# Altium footprint library hphonglib.PcbLib: 703 footprints (part 18 of 44)
Each footprint in its own frame and in the unit in brackets; x right, y up, seen from the top. Pads: shape width x height; smd on the part's side, far side on the other; paste and mask are expansions set on the pad; w line width, h text height; cw(c..) or ccw(c..) is an arc to the next point about the centre after c.
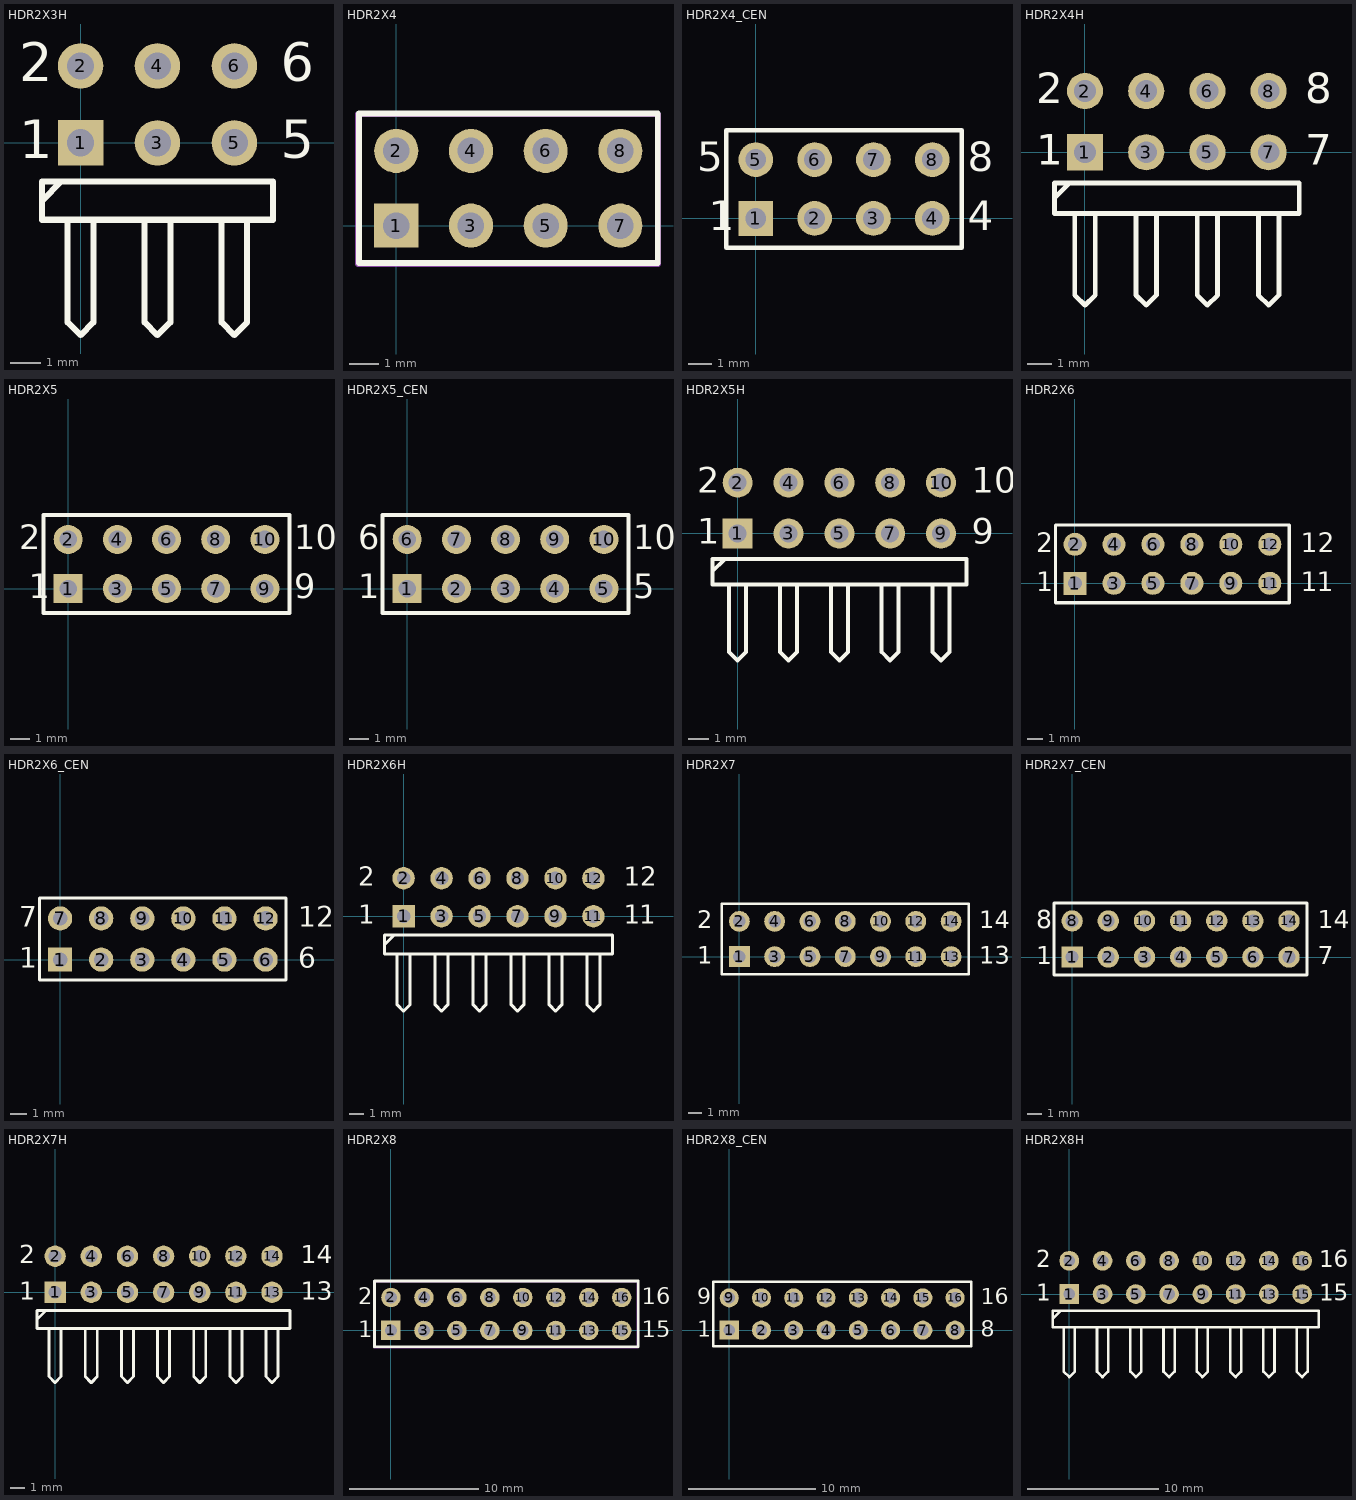
[diagram p17: the footprints below, top view; thin cyan lines are the x and y axes]

## HDR2X3H [mm]
pads (6):
  rect 1.5x1.5 hole 0.9: 1(0,0)
  round 1.5 hole 0.9: 2(0,2.54) 3(2.54,0) 4(2.54,2.54) 5(5.08,0) 6(5.08,2.54)
Top Overlay:
  lines w0.2: -1.27,-1.905 -0.635,-1.27 ; -0.423,-2.54 -0.423,-5.927 0,-6.35 0.423,-5.927 0.423,-2.54 ; 2.117,-2.54 2.117,-5.927 2.54,-6.35 2.963,-5.927 2.963,-2.54 ; 4.657,-2.54 4.657,-5.927 5.08,-6.35 5.503,-5.927 5.503,-2.54 ; -1.27,-2.54 6.35,-2.54 6.35,-1.27 -1.27,-1.27 -1.27,-2.54
  text "2" at -2.032,2.032 h1.27
  text "1" at -2.032,-0.508 h1.27
  text "5" at 6.604,-0.508 h1.27
  text "6" at 6.604,2.032 h1.27
Mechanical 13:
  text ".Designator" at 0.483,0.66 h2.03

## HDR2X4 [mm]
pads (8):
  rect 1.5x1.5 hole 0.9: 1(0,0)
  round 1.5 hole 0.9: 2(0,2.54) 3(2.54,0) 4(2.54,2.54) 5(5.08,0) 6(5.08,2.54) 7(7.62,0) 8(7.62,2.54)
Top Overlay:
  lines w0.2: -1.27,-1.27 8.89,-1.27 8.89,3.81 -1.27,3.81 -1.27,-1.27
  text "." at -2.794,-2.032 h1
Bottom Overlay:
  lines w0.1: -1.295,-1.321 -1.295,3.785 8.89,3.785 8.89,-1.321 -1.295,-1.321
  text "." at -2.794,-2.032 h1
Mechanical 13:
  lines w0.2: -1.3,-1.3 -1.3,3.8 8.9,3.8 8.9,-1.3 -1.3,-1.3
  text ".Designator" at 0.864,0.787 h2.03
3D body: height 8.89, standoff -2.54, extent -0.254,2.286 0.254,2.794
3D body: height 8.89, standoff -2.54, extent -0.254,-0.254 0.254,0.254
3D body: height 8.89, standoff -2.54, extent 2.286,-0.254 2.794,0.254
3D body: height 8.89, standoff -2.54, extent 2.286,2.286 2.794,2.794
3D body: height 8.89, standoff -2.54, extent 4.826,-0.254 5.334,0.254
3D body: height 8.89, standoff -2.54, extent 4.826,2.286 5.334,2.794
3D body: height 2.54, standoff 0.25, extent -1.27,-1.27 1.27,3.81
3D body: height 2.54, standoff 0.25, extent 1.27,-1.27 3.81,3.81
3D body: height 2.54, standoff 0.25, extent 3.81,-1.27 6.35,3.81
3D body: height 8.89, standoff -2.54, extent 7.366,-0.254 7.874,0.254
3D body: height 8.89, standoff -2.54, extent 7.366,2.286 7.874,2.794
3D body: height 2.54, standoff 0.25, extent 6.35,-1.27 8.89,3.81

## HDR2X4_CEN [mm]
pads (8):
  rect 1.5x1.5 hole 0.9: 1(0,0)
  round 1.5 hole 0.9: 2(2.54,0) 3(5.08,0) 4(7.62,0) 5(0,2.54) 6(2.54,2.54) 7(5.08,2.54) 8(7.62,2.54)
Top Overlay:
  lines w0.2: -1.27,-1.27 -1.27,3.81 8.89,3.81 8.89,-1.27 -1.27,-1.27
  text "8" at 9.144,2.032 h1.27
  text "4" at 9.144,-0.508 h1.27
  text "1" at -2.032,-0.508 h1.27
  text "5" at -2.54,2.032 h1.27

## HDR2X4H [mm]
pads (8):
  rect 1.5x1.5 hole 0.9: 1(0,0)
  round 1.5 hole 0.9: 2(0,2.54) 3(2.54,0) 4(2.54,2.54) 5(5.08,0) 6(5.08,2.54) 7(7.62,0) 8(7.62,2.54)
Top Overlay:
  lines w0.2: -1.27,-1.905 -0.635,-1.27 ; -0.423,-2.54 -0.423,-5.927 0,-6.35 0.423,-5.927 0.423,-2.54 ; 2.117,-2.54 2.117,-5.927 2.54,-6.35 2.963,-5.927 2.963,-2.54 ; 4.657,-2.54 4.657,-5.927 5.08,-6.35 5.503,-5.927 5.503,-2.54 ; 7.197,-2.54 7.197,-5.927 7.62,-6.35 8.043,-5.927 8.043,-2.54 ; -1.27,-2.54 8.89,-2.54 8.89,-1.27 -1.27,-1.27 -1.27,-2.54
  text "2" at -2.032,2.032 h1.27
  text "1" at -2.032,-0.508 h1.27
  text "7" at 9.144,-0.508 h1.27
  text "8" at 9.144,2.032 h1.27

## HDR2X5 [mm]
pads (10):
  rect 1.5x1.5 hole 0.9: 1(0,0)
  round 1.5 hole 0.9: 2(0,2.54) 3(2.54,0) 4(2.54,2.54) 5(5.08,0) 6(5.08,2.54) 7(7.62,0) 8(7.62,2.54) 9(10.16,0) 10(10.16,2.54)
Top Overlay:
  lines w0.2: -1.27,-1.27 -1.27,3.81 11.43,3.81 11.43,-1.27 -1.27,-1.27
  text "2" at -2.54,2.032 h1.27
  text "9" at 11.684,-0.508 h1.27
  text "10" at 11.684,2.032 h1.27
  text "1" at -2.032,-0.508 h1.27
Bottom Overlay:
  lines w0.1: -1.27,-1.27 -1.27,3.785 11.405,3.785 11.405,-1.27 -1.27,-1.27
3D body: height 2.54, standoff 0.25, extent -1.295,-1.295 1.245,3.785
3D body: height 2.54, standoff 0.25, extent 1.245,-1.295 3.785,3.785
3D body: height 2.54, standoff 0.25, extent 3.785,-1.295 6.325,3.785
3D body: height 2.54, standoff 0.25, extent 6.325,-1.295 8.865,3.785
3D body: height 2.54, standoff 0.25, extent 8.865,-1.295 11.405,3.785
3D body: height 8.89, standoff -2.54, extent -0.254,2.286 0.254,2.794
3D body: height 8.89, standoff -2.54, extent -0.254,-0.254 0.254,0.254
3D body: height 8.89, standoff -2.54, extent 2.286,2.286 2.794,2.794
3D body: height 8.89, standoff -2.54, extent 2.286,-0.254 2.794,0.254
3D body: height 8.89, standoff -2.54, extent 4.826,-0.254 5.334,0.254
3D body: height 8.89, standoff -2.54, extent 4.826,2.286 5.334,2.794
3D body: height 8.89, standoff -2.54, extent 7.366,2.286 7.874,2.794
3D body: height 8.89, standoff -2.54, extent 7.366,-0.254 7.874,0.254
3D body: height 8.89, standoff -2.54, extent 9.906,-0.254 10.414,0.254
3D body: height 8.89, standoff -2.54, extent 9.906,2.286 10.414,2.794

## HDR2X5_CEN [mm]
pads (10):
  rect 1.5x1.5 hole 0.9: 1(0,0)
  round 1.5 hole 0.9: 2(2.54,0) 3(5.08,0) 4(7.62,0) 5(10.16,0) 6(0,2.54) 7(2.54,2.54) 8(5.08,2.54) 9(7.62,2.54) 10(10.16,2.54)
Top Overlay:
  lines w0.2: -1.27,-1.27 11.43,-1.27 11.43,3.81 -1.27,3.81 -1.27,-1.27
  text "1" at -2.54,-0.508 h1.27
  text "5" at 11.684,-0.508 h1.27
  text "10" at 11.684,2.032 h1.27
  text "6" at -2.54,2.032 h1.27

## HDR2X5H [mm]
pads (10):
  rect 1.5x1.5 hole 0.9: 1(0,0)
  round 1.5 hole 0.9: 2(0,2.54) 3(2.54,0) 4(2.54,2.54) 5(5.08,0) 6(5.08,2.54) 7(7.62,0) 8(7.62,2.54) 9(10.16,0) 10(10.16,2.54)
Top Overlay:
  lines w0.2: -1.27,-1.905 -0.635,-1.27 ; -0.423,-2.54 -0.423,-5.927 0,-6.35 0.423,-5.927 0.423,-2.54 ; 2.117,-2.54 2.117,-5.927 2.54,-6.35 2.963,-5.927 2.963,-2.54 ; 4.657,-2.54 4.657,-5.927 5.08,-6.35 5.503,-5.927 5.503,-2.54 ; 7.197,-2.54 7.197,-5.927 7.62,-6.35 8.043,-5.927 8.043,-2.54 ; 9.737,-2.54 9.737,-5.927 10.16,-6.35 10.583,-5.927 10.583,-2.54 ; -1.27,-2.54 11.43,-2.54 11.43,-1.27 -1.27,-1.27 -1.27,-2.54
  text "2" at -2.032,2.032 h1.27
  text "1" at -2.032,-0.508 h1.27
  text "9" at 11.684,-0.508 h1.27
  text "10" at 11.684,2.032 h1.27

## HDR2X6 [mm]
pads (12):
  rect 1.5x1.5 hole 0.9: 1(0,0)
  round 1.5 hole 0.9: 2(0,2.54) 3(2.54,0) 4(2.54,2.54) 5(5.08,0) 6(5.08,2.54) 7(7.62,0) 8(7.62,2.54) 9(10.16,0) 10(10.16,2.54) 11(12.7,0) 12(12.7,2.54)
Top Overlay:
  lines w0.2: -1.27,-1.27 13.97,-1.27 13.97,3.81 -1.27,3.81 -1.27,-1.27
  text "12" at 14.732,2.032 h1.27
  text "1" at 15.748,-0.508 h1.27
  text "1" at 14.732,-0.508 h1.27
  text "1" at -2.54,-0.508 h1.27
  text "2" at -2.54,2.032 h1.27
Bottom Overlay:
  lines w0.1: -1.245,-1.295 -1.245,3.785 13.945,3.785 13.945,-1.295 -1.245,-1.295
3D body: height 8.89, standoff -2.54, extent -0.259,2.281 0.249,2.789
3D body: height 8.89, standoff -2.54, extent -0.259,-0.259 0.249,0.249
3D body: height 2.54, standoff 0.25, extent -1.275,-1.275 1.265,3.805
3D body: height 8.89, standoff -2.54, extent 2.281,2.281 2.789,2.789
3D body: height 8.89, standoff -2.54, extent 2.281,-0.259 2.789,0.249
3D body: height 2.54, standoff 0.25, extent 1.265,-1.275 3.805,3.805
3D body: height 8.89, standoff -2.54, extent 4.821,2.281 5.329,2.789
3D body: height 8.89, standoff -2.54, extent 4.821,-0.259 5.329,0.249
3D body: height 2.54, standoff 0.25, extent 3.805,-1.275 6.345,3.805
3D body: height 8.89, standoff -2.54, extent 7.361,2.281 7.869,2.789
3D body: height 8.89, standoff -2.54, extent 7.361,-0.259 7.869,0.249
3D body: height 2.54, standoff 0.25, extent 6.345,-1.275 8.885,3.805
3D body: height 8.89, standoff -2.54, extent 9.901,2.281 10.409,2.789
3D body: height 8.89, standoff -2.54, extent 9.901,-0.259 10.409,0.249
3D body: height 2.54, standoff 0.25, extent 8.885,-1.275 11.425,3.805
3D body: height 8.89, standoff -2.54, extent 12.441,2.281 12.949,2.789
3D body: height 8.89, standoff -2.54, extent 12.441,-0.259 12.949,0.249
3D body: height 2.54, standoff 0.25, extent 11.425,-1.275 13.965,3.805

## HDR2X6_CEN [mm]
pads (12):
  rect 1.5x1.5 hole 0.9: 1(0,0)
  round 1.5 hole 0.9: 2(2.54,0) 3(5.08,0) 4(7.62,0) 5(10.16,0) 6(12.7,0) 7(0,2.54) 8(2.54,2.54) 9(5.08,2.54) 10(7.62,2.54) 11(10.16,2.54) 12(12.7,2.54)
Top Overlay:
  lines w0.2: -1.27,-1.27 13.97,-1.27 13.97,3.81 -1.27,3.81 -1.27,-1.27
  text "12" at 14.732,2.032 h1.27
  text "6" at 14.732,-0.508 h1.27
  text "1" at -2.54,-0.508 h1.27
  text "7" at -2.54,2.032 h1.27

## HDR2X6H [mm]
pads (12):
  rect 1.5x1.5 hole 0.9: 1(0,0)
  round 1.5 hole 0.9: 2(0,2.54) 3(2.54,0) 4(2.54,2.54) 5(5.08,0) 6(5.08,2.54) 7(7.62,0) 8(7.62,2.54) 9(10.16,0) 10(10.16,2.54) 11(12.7,0) 12(12.7,2.54)
Top Overlay:
  lines w0.2: -1.27,-1.905 -0.635,-1.27 ; -0.423,-2.54 -0.423,-5.927 0,-6.35 0.423,-5.927 0.423,-2.54 ; 2.117,-2.54 2.117,-5.927 2.54,-6.35 2.963,-5.927 2.963,-2.54 ; 4.657,-2.54 4.657,-5.927 5.08,-6.35 5.503,-5.927 5.503,-2.54 ; 7.197,-2.54 7.197,-5.927 7.62,-6.35 8.043,-5.927 8.043,-2.54 ; 9.737,-2.54 9.737,-5.927 10.16,-6.35 10.583,-5.927 10.583,-2.54 ; 12.277,-2.54 12.277,-5.927 12.7,-6.35 13.123,-5.927 13.123,-2.54 ; -1.27,-2.54 13.97,-2.54 13.97,-1.27 -1.27,-1.27 -1.27,-2.54
  text "2" at -3.048,2.032 h1.27
  text "1" at -3.048,-0.508 h1.27
  text "1" at 14.732,-0.508 h1.27
  text "1" at 15.748,-0.508 h1.27
  text "12" at 14.732,2.032 h1.27

## HDR2X7 [mm]
pads (14):
  rect 1.5x1.5 hole 0.9: 1(0,0)
  round 1.5 hole 0.9: 2(0,2.54) 3(2.54,0) 4(2.54,2.54) 5(5.08,0) 6(5.08,2.54) 7(7.62,0) 8(7.62,2.54) 9(10.16,0) 10(10.16,2.54) 11(12.7,0) 12(12.7,2.54) 13(15.24,0) 14(15.24,2.54)
Top Overlay:
  lines w0.2: -1.27,-1.27 16.51,-1.27 16.51,3.81 -1.27,3.81 -1.27,-1.27
  text "13" at 17.272,-0.508 h1.27
  text "14" at 17.272,2.032 h1.27
  text "1" at -3.048,-0.508 h1.27
  text "2" at -3.048,2.032 h1.27
Bottom Overlay:
  lines w0.1: -1.295,-1.295 -1.295,3.835 16.485,3.835 16.485,-1.295 -1.295,-1.295
3D body: height 2.54, standoff 0.25, extent 13.965,-1.275 16.505,3.805
3D body: height 8.89, standoff -2.54, extent 14.981,-0.259 15.489,0.249
3D body: height 8.89, standoff -2.54, extent 14.981,2.281 15.489,2.789
3D body: height 2.54, standoff 0.25, extent 11.425,-1.275 13.965,3.805
3D body: height 8.89, standoff -2.54, extent 12.441,-0.259 12.949,0.249
3D body: height 8.89, standoff -2.54, extent 12.441,2.281 12.949,2.789
3D body: height 2.54, standoff 0.25, extent 8.885,-1.275 11.425,3.805
3D body: height 8.89, standoff -2.54, extent 9.901,-0.259 10.409,0.249
3D body: height 8.89, standoff -2.54, extent 9.901,2.281 10.409,2.789
3D body: height 2.54, standoff 0.25, extent 6.345,-1.275 8.885,3.805
3D body: height 8.89, standoff -2.54, extent 7.361,-0.259 7.869,0.249
3D body: height 8.89, standoff -2.54, extent 7.361,2.281 7.869,2.789
3D body: height 2.54, standoff 0.25, extent 3.805,-1.275 6.345,3.805
3D body: height 8.89, standoff -2.54, extent 4.821,-0.259 5.329,0.249
3D body: height 8.89, standoff -2.54, extent 4.821,2.281 5.329,2.789
3D body: height 2.54, standoff 0.25, extent 1.265,-1.275 3.805,3.805
3D body: height 8.89, standoff -2.54, extent 2.281,-0.259 2.789,0.249
3D body: height 8.89, standoff -2.54, extent 2.281,2.281 2.789,2.789
3D body: height 2.54, standoff 0.25, extent -1.275,-1.275 1.265,3.805
3D body: height 8.89, standoff -2.54, extent -0.259,-0.259 0.249,0.249
3D body: height 8.89, standoff -2.54, extent -0.259,2.281 0.249,2.789

## HDR2X7_CEN [mm]
pads (14):
  rect 1.5x1.5 hole 0.9: 1(0,0)
  round 1.5 hole 0.9: 2(2.54,0) 3(5.08,0) 4(7.62,0) 5(10.16,0) 6(12.7,0) 7(15.24,0) 8(0,2.54) 9(2.54,2.54) 10(5.08,2.54) 11(7.62,2.54) 12(10.16,2.54) 13(12.7,2.54) 14(15.24,2.54)
Top Overlay:
  lines w0.2: -1.27,-1.27 -1.27,3.81 16.51,3.81 16.51,-1.27 -1.27,-1.27
  text "14" at 17.272,2.032 h1.27
  text "7" at 17.272,-0.508 h1.27
  text "1" at -2.54,-0.508 h1.27
  text "8" at -2.54,2.032 h1.27

## HDR2X7H [mm]
pads (14):
  rect 1.5x1.5 hole 0.9: 1(0,0)
  round 1.5 hole 0.9: 2(0,2.54) 3(2.54,0) 4(2.54,2.54) 5(5.08,0) 6(5.08,2.54) 7(7.62,0) 8(7.62,2.54) 9(10.16,0) 10(10.16,2.54) 11(12.7,0) 12(12.7,2.54) 13(15.24,0) 14(15.24,2.54)
Top Overlay:
  lines w0.2: -1.27,-1.905 -0.635,-1.27 ; -0.423,-2.54 -0.423,-5.927 0,-6.35 0.423,-5.927 0.423,-2.54 ; 2.117,-2.54 2.117,-5.927 2.54,-6.35 2.963,-5.927 2.963,-2.54 ; 4.657,-2.54 4.657,-5.927 5.08,-6.35 5.503,-5.927 5.503,-2.54 ; 7.197,-2.54 7.197,-5.927 7.62,-6.35 8.043,-5.927 8.043,-2.54 ; 9.737,-2.54 9.737,-5.927 10.16,-6.35 10.583,-5.927 10.583,-2.54 ; 12.277,-2.54 12.277,-5.927 12.7,-6.35 13.123,-5.927 13.123,-2.54 ; 14.817,-2.54 14.817,-5.927 15.24,-6.35 15.663,-5.927 15.663,-2.54 ; -1.27,-2.54 -1.27,-1.27 16.51,-1.27 16.51,-2.54 -1.27,-2.54
  text "2" at -2.54,2.032 h1.27
  text "1" at -2.54,-0.508 h1.27
  text "13" at 17.272,-0.508 h1.27
  text "14" at 17.272,2.032 h1.27

## HDR2X8 [mm]
pads (16):
  rect 1.5x1.5 hole 0.9: 1(0,0)
  round 1.5 hole 0.9: 2(0,2.54) 3(2.54,0) 4(2.54,2.54) 5(5.08,0) 6(5.08,2.54) 7(7.62,0) 8(7.62,2.54) 9(10.16,0) 10(10.16,2.54) 11(12.7,0) 12(12.7,2.54) 13(15.24,0) 14(15.24,2.54) 15(17.78,0) 16(17.78,2.54)
Top Overlay:
  lines w0.2: -1.27,-1.27 -1.27,3.81 19.05,3.81 19.05,-1.27 -1.27,-1.27
  text "." at -2.184,-1.575 h0.76
  text "2" at -2.54,2.032 h1.27
  text "1" at -2.54,-0.508 h1.27
  text "15" at 19.304,-0.508 h1.27
  text "16" at 19.304,2.032 h1.27
Bottom Overlay:
  lines w0.2: -1.27,-1.245 19.05,-1.245 19.05,3.835 -1.27,3.835 -1.27,-1.245
  text "." at -2.184,-1.575 h0.76
Mechanical 13:
  lines w0.2: -1.3,-1.3 -1.3,3.8 19,3.8 19,-1.3 -1.3,-1.3
3D body: height 8.89, standoff -2.54, extent -0.259,2.281 0.249,2.789
3D body: height 8.89, standoff -2.54, extent -0.259,-0.259 0.249,0.249
3D body: height 2.54, standoff 0.25, extent -1.275,-1.275 1.265,3.805
3D body: height 8.89, standoff -2.54, extent 2.281,2.281 2.789,2.789
3D body: height 8.89, standoff -2.54, extent 2.281,-0.259 2.789,0.249
3D body: height 2.54, standoff 0.25, extent 1.265,-1.275 3.805,3.805
3D body: height 8.89, standoff -2.54, extent 4.821,2.281 5.329,2.789
3D body: height 8.89, standoff -2.54, extent 4.821,-0.259 5.329,0.249
3D body: height 2.54, standoff 0.25, extent 3.805,-1.275 6.345,3.805
3D body: height 8.89, standoff -2.54, extent 7.361,2.281 7.869,2.789
3D body: height 8.89, standoff -2.54, extent 7.361,-0.259 7.869,0.249
3D body: height 2.54, standoff 0.25, extent 6.345,-1.275 8.885,3.805
3D body: height 8.89, standoff -2.54, extent 9.901,2.281 10.409,2.789
3D body: height 8.89, standoff -2.54, extent 9.901,-0.259 10.409,0.249
3D body: height 2.54, standoff 0.25, extent 8.885,-1.275 11.425,3.805
3D body: height 8.89, standoff -2.54, extent 12.441,2.281 12.949,2.789
3D body: height 8.89, standoff -2.54, extent 12.441,-0.259 12.949,0.249
3D body: height 2.54, standoff 0.25, extent 11.425,-1.275 13.965,3.805
3D body: height 8.89, standoff -2.54, extent 14.981,2.281 15.489,2.789
3D body: height 8.89, standoff -2.54, extent 14.981,-0.259 15.489,0.249
3D body: height 2.54, standoff 0.25, extent 13.965,-1.275 16.505,3.805
3D body: height 8.89, standoff -2.54, extent 17.521,2.281 18.029,2.789
3D body: height 8.89, standoff -2.54, extent 17.521,-0.259 18.029,0.249
3D body: height 2.54, standoff 0.25, extent 16.505,-1.275 19.045,3.805

## HDR2X8_CEN [mm]
pads (16):
  rect 1.5x1.5 hole 0.9: 1(0,0)
  round 1.5 hole 0.9: 2(2.54,0) 3(5.08,0) 4(7.62,0) 5(10.16,0) 6(12.7,0) 7(15.24,0) 8(17.78,0) 9(0,2.54) 10(2.54,2.54) 11(5.08,2.54) 12(7.62,2.54) 13(10.16,2.54) 14(12.7,2.54) 15(15.24,2.54) 16(17.78,2.54)
Top Overlay:
  lines w0.2: -1.27,-1.27 19.05,-1.27 19.05,3.81 -1.27,3.81 -1.27,-1.27
  text "16" at 19.812,2.032 h1.27
  text "8" at 19.812,-0.508 h1.27
  text "1" at -2.54,-0.508 h1.27
  text "9" at -2.54,2.032 h1.27

## HDR2X8H [mm]
pads (16):
  rect 1.5x1.5 hole 0.9: 1(0,0)
  round 1.5 hole 0.9: 2(0,2.54) 3(2.54,0) 4(2.54,2.54) 5(5.08,0) 6(5.08,2.54) 7(7.62,0) 8(7.62,2.54) 9(10.16,0) 10(10.16,2.54) 11(12.7,0) 12(12.7,2.54) 13(15.24,0) 14(15.24,2.54) 15(17.78,0) 16(17.78,2.54)
Top Overlay:
  lines w0.2: -1.27,-1.905 -0.635,-1.27 ; -0.423,-2.54 -0.423,-5.927 0,-6.35 0.423,-5.927 0.423,-2.54 ; 2.117,-2.54 2.117,-5.927 2.54,-6.35 2.963,-5.927 2.963,-2.54 ; 4.657,-2.54 4.657,-5.927 5.08,-6.35 5.503,-5.927 5.503,-2.54 ; 7.197,-2.54 7.197,-5.927 7.62,-6.35 8.043,-5.927 8.043,-2.54 ; 9.737,-2.54 9.737,-5.927 10.16,-6.35 10.583,-5.927 10.583,-2.54 ; 12.277,-2.54 12.277,-5.927 12.7,-6.35 13.123,-5.927 13.123,-2.54 ; 14.817,-2.54 14.817,-5.927 15.24,-6.35 15.663,-5.927 15.663,-2.54 ; 17.357,-2.54 17.357,-5.927 17.78,-6.35 18.203,-5.927 18.203,-2.54 ; -1.27,-2.54 -1.27,-1.27 19.05,-1.27 19.05,-2.54 -1.27,-2.54
  text "2" at -2.54,2.032 h1.27
  text "1" at -2.54,-0.508 h1.27
  text "15" at 19.069,-0.508 h1.27
  text "16" at 19.092,2.032 h1.27